# Altium footprint library VC_PCBLib.PcbLib: 63 footprints (part 2 of 4)
Each footprint in its own frame and in the unit in brackets; x right, y up, seen from the top. Pads: shape width x height; smd on the part's side, far side on the other; paste and mask are expansions set on the pad; w line width, h text height; cw(c..) or ccw(c..) is an arc to the next point about the centre after c.
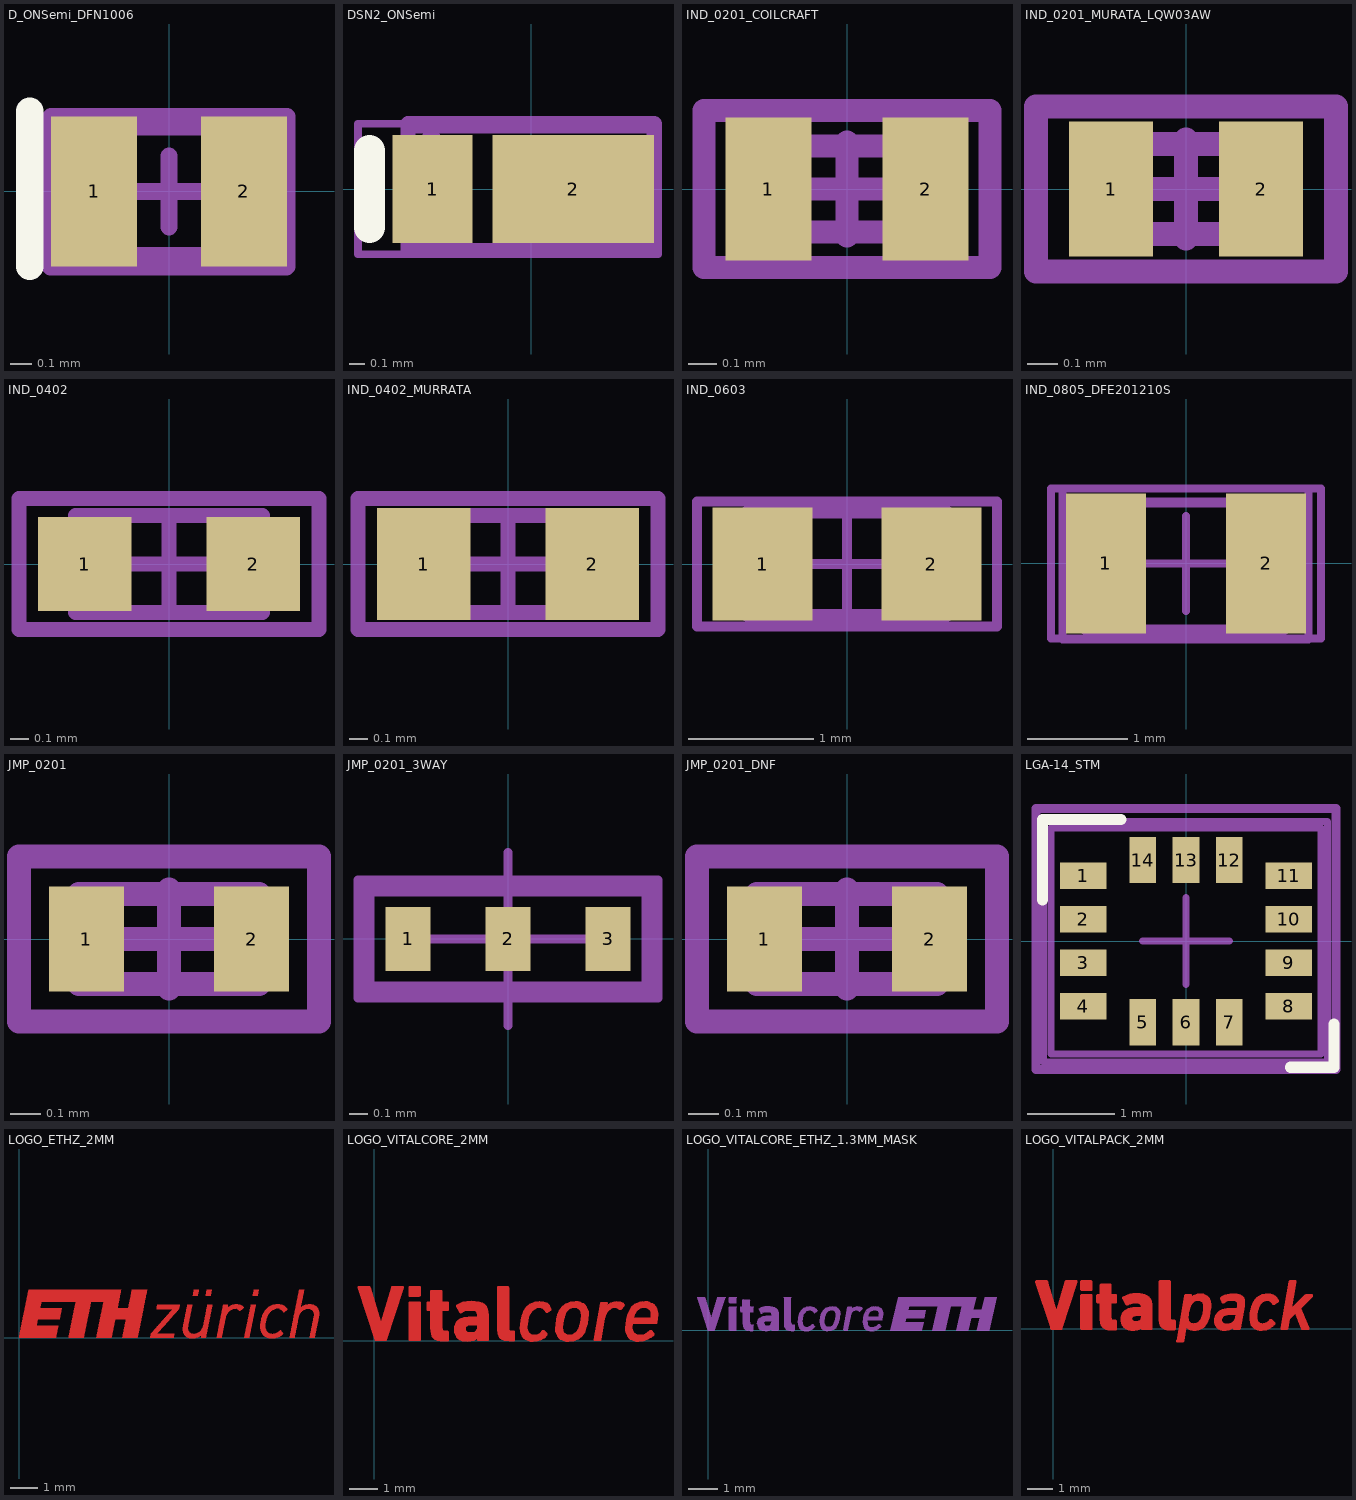
[diagram p1: the footprints below, top view; thin cyan lines are the x and y axes]

## D_ONSemi_DFN1006 [mm]
pads (2):
  rect 0.4x0.7 smd: 1(-0.35,0) 2(0.35,0)
Top Overlay:
  lines w0.127: -0.65,-0.35 -0.65,0.375
Top Assembly:
  circle w0.127: c-0.425,0.225 r0.025
  lines w0.08: -0.552,-0.352 -0.552,0.348 0.548,0.348 0.548,-0.352 -0.552,-0.352
Top Component Outline:
  lines w0.08: -0.5,-0.3 -0.5,0.3 0.5,0.3 0.5,-0.3 -0.5,-0.3
Top Courtyard:
  lines w0.08: -0.55,-0.35 -0.55,0.35 0.55,0.35 0.55,-0.35 -0.55,-0.35
Top Component Center:
  lines w0.08: -0.165,0 0.165,0 ; -0.05,0 0.05,0 ; 0,-0.165 0,0.165 ; 0,-0.05 0,0.05
3D body "DFN1006H4-2.stp": height 0.4, standoff 0, extent -0.5,-0.3 0.5,0.3

## DSN2_ONSemi [mm]
pads (2):
  rect 0.52x0.7 smd paste+0 mask+0: 1(-0.64,0)
  rect 1.05x0.7 smd paste+0 mask+0: 2(0.275,0)
Top Overlay:
  lines w0.2: -1.05,-0.25 -1.05,0.25
Top Assembly:
  lines w0.1: -0.8,-0.4 -0.8,0.425 0.8,0.425 0.8,-0.4 -0.8,-0.4
  lines w0.127: -0.65,-0.325 -0.65,0.325
Top Component Outline:
  lines w0.08: -0.8,-0.4 -0.8,0.4 0.8,0.4 0.8,-0.4 -0.8,-0.4
Top Courtyard:
  lines w0.05: -1.125,-0.425 0.825,-0.425 0.825,0.425 -1.125,0.425 -1.125,-0.425
Top Component Center:
  lines w0.08: -0.165,0 0.165,0 ; -0.05,0 0.05,0 ; 0,-0.165 0,0.165 ; 0,-0.05 0,0.05
  lines w0.1: -0.152,0 0.152,0 ; 0,-0.152 0,0.152
3D body "DSN2-152AB_ONS.step": height 0.31, standoff 0, extent -0.841,-0.406 0.741,0.406

## IND_0201_COILCRAFT [mm] "0201 Inductor"
height 0.52
pads (2):
  rect 0.3x0.5 smd: 1(-0.275,0) 2(0.275,0)
Top Assembly:
  lines w0.08: -0.5,-0.275 -0.5,0.275 0.5,0.275 0.5,-0.275 -0.5,-0.275
Top Component Outline:
  lines w0.08: -0.3,-0.15 -0.3,0.15 0.3,0.15 0.3,-0.15 -0.3,-0.15
Top Courtyard:
  lines w0.08: -0.5,-0.275 0.5,-0.275 0.5,0.275 -0.5,0.275 -0.5,-0.275
Top Component Center:
  lines w0.08: -0.165,0 0.165,0 ; -0.05,0 0.05,0 ; 0,-0.165 0,0.165 ; 0,-0.05 0,0.05
3D body "Coilcraft-0201DS.STEP": height 0.46, standoff 0, extent -0.293,-0.231 0.293,0.231

## IND_0201_MURATA_LQW03AW [mm] "0201 Inductor"
height 0.52
pads (2):
  rect 0.28x0.45 smd: 1(-0.25,0) 2(0.25,0)
Top Assembly:
  lines w0.08: -0.5,-0.275 -0.5,0.275 0.5,0.275 0.5,-0.275 -0.5,-0.275
Top Component Outline:
  lines w0.08: -0.3,-0.15 -0.3,0.15 0.3,0.15 0.3,-0.15 -0.3,-0.15
Top Courtyard:
  lines w0.08: -0.5,-0.275 0.5,-0.275 0.5,0.275 -0.5,0.275 -0.5,-0.275
Top Component Center:
  lines w0.08: -0.165,0 0.165,0 ; -0.05,0 0.05,0 ; 0,-0.165 0,0.165 ; 0,-0.05 0,0.05
3D body "LQW03AW5N6J00D.STEP": height 0.45, standoff 0, extent -0.265,-0.2 0.265,0.2

## IND_0402 [mm] "0402 Inductor"
height 0.52
pads (2):
  rect 0.5x0.5 smd: 1(-0.45,0) 2(0.45,0)
Top Assembly:
  lines w0.08: -0.8,-0.35 -0.8,0.35 0.8,0.35 0.8,-0.35 -0.8,-0.35
Top Component Outline:
  lines w0.08: -0.5,-0.26 0.5,-0.26 0.5,0.26 -0.5,0.26 -0.5,-0.26
Top Courtyard:
  lines w0.08: -0.8,-0.35 0.8,-0.35 0.8,0.35 -0.8,0.35 -0.8,-0.35
Top Component Center:
  lines w0.08: -0.26,0 0.26,0 ; 0,-0.26 0,0.26
3D body "FER 0402.STEP": height 0.56, standoff 0.04, extent -0.5,-0.262 0.5,0.262

## IND_0402_MURRATA [mm] "0402 Inductor"
height 0.52
pads (2):
  rect 0.5x0.6 smd: 1(-0.45,0) 2(0.45,0)
Top Assembly:
  lines w0.08: -0.8,-0.35 0.8,-0.35 0.8,0.35 -0.8,0.35 -0.8,-0.35
Top Component Outline:
  lines w0.08: -0.5,-0.26 -0.5,0.26 0.5,0.26 0.5,-0.26 -0.5,-0.26
Top Courtyard:
  lines w0.08: -0.8,-0.35 -0.8,0.35 0.8,0.35 0.8,-0.35 -0.8,-0.35
Top Component Center:
  lines w0.08: -0.26,0 0.26,0 ; 0,-0.26 0,0.26
3D body "LQW15AN5N7G80B.STEP": height 0.6, standoff 0, extent -0.5,-0.3 0.5,0.3

## IND_0603 [mm] "0603 Inductor"
height 0.89
pads (2):
  rect 0.8x0.9 smd: 1(-0.675,0) 2(0.675,0)
Top Assembly:
  lines w0.08: -1.2,-0.5 -1.2,0.5 1.2,0.5 1.2,-0.5 -1.2,-0.5
Top Component Outline:
  lines w0.1: -0.8,-0.41 -0.8,0.415 0.8,0.415 0.8,-0.41 -0.8,-0.41
Top Component Center:
  lines w0.08: -0.475,0 0.475,0 ; 0,-0.475 0,0.475
3D body "FER 0603.STEP": height 0.82, standoff 0, extent -0.8,-0.412 0.8,0.412

## IND_0805_DFE201210S [mm] "0805 Inductor"
height 0.89
pads (2):
  rect 0.8x1.4 smd: 1(-0.8,0) 2(0.8,0)
Top Assembly:
  lines w0.08: -1.35,-0.75 1.35,-0.75 1.35,0.75 -1.35,0.75 -1.35,-0.75
Top Component Outline:
  lines w0.1: -1.016,-0.66 0.991,-0.66 0.991,0.61 -1.016,0.61 -1.016,-0.66
Top Courtyard:
  lines w0.08: -1.237,-0.763 1.226,-0.763 1.226,0.75 -1.237,0.75 -1.237,-0.763
Top Component Center:
  lines w0.08: -0.475,0 0.475,0 ; 0,-0.475 0,0.475
3D body "FER 0805.STEP": height 1.02, standoff -0.26, extent -1,-0.639 1,0.635

## JMP_0201 [mm] "0201 Jumper"
height 0.26
pads (2):
  rect 0.25x0.35 smd: 1(-0.275,0) 2(0.275,0)
Top Assembly:
  lines w0.08: -0.5,-0.275 -0.5,0.275 0.5,0.275 0.5,-0.275 -0.5,-0.275
Top Component Outline:
  lines w0.08: -0.3,-0.15 -0.3,0.15 0.3,0.15 0.3,-0.15 -0.3,-0.15
Top Courtyard:
  lines w0.08: -0.5,-0.275 0.5,-0.275 0.5,0.275 -0.5,0.275 -0.5,-0.275
Top Component Center:
  lines w0.08: -0.165,0 0.165,0 ; -0.05,0 0.05,0 ; 0,-0.165 0,0.165 ; 0,-0.05 0,0.05
3D body "R_0201_0603Metric.step": height 0.22, standoff -0.01, extent -0.3,-0.15 0.3,0.15

## JMP_0201_3WAY [mm] "Jumper 3 pins 0201x2"
height 0.6
pads (3):
  rect 0.25x0.35 smd: 1(-0.55,0) 2(0,0) 3(0.55,0)
Top Assembly:
  lines w0.08: -0.225,-0.275 0.775,-0.275 0.775,0.275 -0.225,0.275 ; 0.225,-0.275 -0.775,-0.275 -0.775,0.275 0.225,0.275
Top Component Outline:
  lines w0.05: -0.775,-0.275 0.775,-0.275 0.775,0.275 -0.775,0.275 -0.775,-0.275
Top Courtyard:
  lines w0.05: -0.825,-0.325 0.825,-0.325 0.825,0.325 -0.825,0.325 -0.825,-0.325
Top Component Center:
  lines w0.05: -0.475,0 0.475,0 ; 0,-0.475 0,0.475
3D body "R_0201_0603Metric.step": height 0.22, standoff -0.01, extent -0.575,-0.15 0.025,0.15
3D body "R_0201_0603Metric.step": height 0.22, standoff -0.01, extent -0.025,-0.15 0.575,0.15

## JMP_0201_DNF [mm] "0201 Jumper, Not populated."
height 0.26
pads (2):
  rect 0.25x0.35 smd: 1(-0.275,0) 2(0.275,0)
Top Assembly:
  lines w0.08: -0.5,-0.275 0.5,-0.275 0.5,0.275 -0.5,0.275 -0.5,-0.275
Top Component Outline:
  lines w0.08: -0.3,-0.15 0.3,-0.15 0.3,0.15 -0.3,0.15 -0.3,-0.15
Top Courtyard:
  lines w0.08: -0.5,-0.275 -0.5,0.275 0.5,0.275 0.5,-0.275 -0.5,-0.275
Top Component Center:
  lines w0.08: -0.165,0 0.165,0 ; -0.05,0 0.05,0 ; 0,-0.165 0,0.165 ; 0,-0.05 0,0.05
3D body "R_0201_0603Metric.step": height 0.22, standoff -0.01, extent -0.3,-0.15 0.3,0.15

## LGA-14_STM [mil] "LG1-14 package of STM comatible with various components"
pads (14):
  rect 21x12 smd: 1(-46.5,29.54) 2(-46.5,9.85) 3(-46.5,-9.85) 4(-46.5,-29.54) 8(46.5,-29.54) 9(46.5,-9.85) 10(46.5,9.85) 11(46.5,29.54)
  rect 12x21 smd: 5(-19.69,-36.74) 6(0,-36.74) 7(19.69,-36.74) 12(19.69,36.74) 13(0,36.74) 14(-19.69,36.74)
Top Overlay:
  lines w5: -64.96,18.7 -64.96,55.12 -29.53,55.12 ; 47.24,-57.09 66.93,-57.09 66.93,-37.4
Top Assembly:
  lines w3.94: -67.91,-58.07 67.91,-58.07 67.91,60.04 -67.91,60.04 -67.91,-58.07
Top Component Outline:
  lines w3.15: -61.02,-51.18 -61.02,51.18 61.02,51.18 61.02,-51.18 -61.02,-51.18
Top Courtyard:
  lines w3.15: -64.48,-54.64 -64.48,54.14 63.98,54.14 63.98,-54.64 -64.48,-54.64
Top Component Center:
  lines w3.15: -19.68,0 19.69,0 ; 0,-19.69 0,19.68
3D body "QFN_DHCXTR_STM.step": height 55.12, standoff 0, extent -60.98,-50.98 60.99,50.99

## LOGO_ETHZ_2MM [mm] "Logo ETH Zurich"
Top Layer:
  drawing of 11 lines, arcs and shapes, not listed
Top Solder:
  drawing of 10 lines, arcs and shapes, not listed

## LOGO_VITALCORE_2MM [mm]
Top Layer:
  region: 9.675,0.35 9.5,0.225 9.3,0.175 9.125,0.2 9.025,0.35 9,0.525 9.025,0.6 9.05,0.6 9.05,0.775 9.125,1 9.25,1.125 9.425,1.175 9.6,1.125 9.675,1 9.7,0.875 9.7,0.775 9.05,0.775 9.05,0.6 9.85,0.6 9.9,0.725 9.925,0.95 9.875,1.15 9.625,1.35 9.4,1.375 9.075,1.225 8.85,0.9 8.8,0.45 8.85,0.15 8.975,0.025 9.15,-0.025 9.35,0 9.5,0.025 9.775,0.175 9.775,0.25
  region: 8.146,1.327 7.934,1.327 7.703,0.024 7.906,-0.001 8.102,0.934 8.227,1.115 8.352,1.165 8.489,1.149 8.598,1.081 8.745,1.252 8.617,1.336 8.436,1.365 8.315,1.308 8.152,1.218 8.131,1.174 8.15,1.325
  region: 6.95,1.35 6.675,1.275 6.45,1 6.35,0.575 6.375,0.25 6.475,0.075 6.65,0 6.825,-0.025 7.025,0 7.3,0.2 7.475,0.65 7.475,1.025 7.4,1.225 7.2,1.35 6.95,1.35 6.95,1.15 7.025,1.15 7.15,1.125 7.25,0.975 7.225,0.625 7.1,0.3 6.95,0.2 6.75,0.2 6.625,0.25 6.575,0.5 6.6,0.75 6.725,1.025 6.875,1.125 6.95,1.15
  region: 6.018,0.989 6.186,1.111 6.024,1.308 5.765,1.378 5.56,1.33 5.366,1.21 5.19,0.906 5.107,0.57 5.131,0.259 5.248,0.069 5.36,-0.008 5.614,-0.024 5.843,0.035 6.01,0.187 6.048,0.243 5.925,0.352 5.789,0.253 5.611,0.173 5.427,0.216 5.344,0.349 5.352,0.688 5.416,0.946 5.603,1.14 5.779,1.154 5.899,1.148 5.978,1.063 6.025,1
  region: 4.698,0.394 4.698,1.868 4.325,1.868 4.325,0.275 4.375,0.15 4.475,0.05 4.6,0 4.9,0 4.9,0.3 4.756,0.336
  region: 3.625,0.825 3.275,0.825 3.05,0.775 2.875,0.65 2.8,0.425 2.825,0.225 2.95,0.05 3.225,-0.025 3.45,0 3.625,0.125 3.625,0.4 3.55,0.325 3.45,0.275 3.275,0.275 3.175,0.35 3.175,0.45 3.225,0.525 3.35,0.55 3.625,0.55
  region: 2.875,1.225 3.027,0.959 3.142,1.046 3.38,1.048 3.551,1.033 3.597,0.968 3.619,0.832 3.625,0.825 3.625,0.025 3.975,0.025 3.975,0.925 3.95,1.125 3.825,1.275 3.625,1.35 3.45,1.375 3.225,1.375 3.025,1.325
  region: 2,1.725 2.35,1.725 2.375,1.35 2.575,1.35 2.575,1.05 2.375,1.05 2.35,0.575 2.375,0.4 2.4,0.325 2.55,0.325 2.575,0.3 2.575,0 2.5,-0.025 2.35,0 2.125,0.05 2,0.2 1.975,0.425 1.975,0.675 1.967,1.062 1.85,1.05 1.85,1.325 2,1.35 1.975,1.725 2.025,1.75
  region: 1.225,1.35 1.218,0.022 1.602,0.014 1.602,1.339
  region: 1.225,1.875 1.225,1.575 1.6,1.575 1.6,1.875
  region: 0.031,0.009 -0.575,1.875 -0.153,1.877 0.232,0.627 0.613,1.881 1.019,1.875 0.405,0.009 0.037,0.014
  lines w0.05: 3.364,0.266 3.473,0.277 3.55,0.312 3.597,0.369 3.613,0.451 3.613,0.542 3.596,0.558 3.408,0.558 3.302,0.549 3.229,0.522 3.185,0.474 3.171,0.406 3.183,0.345 3.22,0.301 3.28,0.274 3.364,0.266 ; 3.364,0.266 3.364,0.266 ; 5.553,-0.024 5.695,-0.009 5.824,0.035 5.936,0.105 6.031,0.199 6.039,0.22 6.031,0.238 5.931,0.34 5.913,0.347 5.895,0.335 5.821,0.263 5.745,0.215 5.667,0.186 5.586,0.177 5.472,0.197 5.393,0.253 5.347,0.345 5.332,0.47 5.359,0.691 5.392,0.823 5.437,0.942 5.5,1.035 5.577,1.104 5.666,1.146 5.763,1.16 5.845,1.151 5.91,1.122 5.964,1.074 6.008,1.005 6.026,0.993 6.047,0.997 6.166,1.083 6.179,1.1 6.177,1.121 6.115,1.223 6.028,1.297 5.918,1.343 5.785,1.359 5.608,1.337 5.455,1.271 5.329,1.164 5.233,1.016 5.177,0.871 5.139,0.714 5.109,0.431 5.116,0.33 5.138,0.24 5.175,0.162 5.225,0.097 5.289,0.045 5.365,0.007 5.453,-0.016 5.553,-0.024 ; 5.553,-0.024 5.553,-0.024 ; 9.253,-0.024 9.407,-0.007 9.547,0.04 9.669,0.111 9.772,0.199 9.783,0.221 9.775,0.241 9.689,0.337 9.671,0.344 9.648,0.335 9.575,0.273 9.489,0.223 9.393,0.189 9.289,0.177 9.166,0.195 9.078,0.249 9.025,0.342 9.007,0.473 9.016,0.586 9.035,0.602 9.844,0.602 9.866,0.61 9.877,0.63 9.91,0.909 9.901,1.013 9.877,1.104 9.837,1.181 9.784,1.245 9.72,1.294 9.645,1.33 9.56,1.352 9.468,1.359 9.283,1.335 9.128,1.268 9.004,1.158 8.911,1.011 8.86,0.879 8.824,0.73 8.795,0.44 8.802,0.336 8.824,0.244 8.86,0.164 8.911,0.098 8.976,0.045 9.055,0.007 9.147,-0.016 9.253,-0.024 ; 9.253,-0.024 9.253,-0.024 ; -0.568,1.853 -0.565,1.875 -0.543,1.883 -0.184,1.883 -0.161,1.877 -0.148,1.856 0.227,0.624 0.235,0.624 0.6,1.856 0.613,1.877 0.636,1.883 0.992,1.883 1.011,1.875 1.014,1.853 0.418,0.034 0.405,0.014 0.385,0.006 0.064,0.006 0.041,0.014 0.028,0.034 -0.568,1.853 ; 1.217,0.034 1.224,0.014 1.244,0.006 1.576,0.006 1.596,0.014 1.603,0.034 1.603,1.315 1.596,1.335 1.576,1.342 1.244,1.342 1.224,1.335 1.217,1.315 1.217,0.034 ; 1.217,1.582 1.224,1.562 1.244,1.555 1.576,1.555 1.596,1.562 1.603,1.582 1.603,1.856 1.596,1.876 1.576,1.883 1.244,1.883 1.224,1.876 1.217,1.856 1.217,1.582 ; 1.85,1.085 1.858,1.065 1.878,1.058 1.961,1.058 1.977,1.041 1.977,0.434 2,0.235 2.03,0.159 2.074,0.097 2.132,0.049 2.205,0.016 2.295,-0.004 2.402,-0.01 2.548,-0.01 2.569,-0.003 2.576,0.017 2.576,0.29 2.569,0.31 2.548,0.318 2.482,0.318 2.426,0.325 2.388,0.347 2.367,0.388 2.361,0.451 2.361,1.041 2.377,1.058 2.548,1.058 2.569,1.065 2.576,1.085 2.576,1.315 2.569,1.335 2.548,1.342 2.377,1.342 2.361,1.359 2.361,1.718 2.353,1.738 2.333,1.745 2.005,1.745 1.985,1.738 1.977,1.718 1.977,1.359 1.961,1.342 1.878,1.342 1.858,1.335 1.85,1.315 1.85,1.085 ; 2.804,0.384 2.814,0.488 2.844,0.576 2.892,0.65 2.957,0.71 3.037,0.757 3.132,0.789 3.359,0.815 3.596,0.815 3.613,0.832 3.613,0.881 3.6,0.962 3.556,1.019 3.472,1.052 3.339,1.063 3.163,1.038 3.041,0.978 3.021,0.971 3.005,0.983 2.881,1.201 2.877,1.224 2.889,1.24 2.984,1.295 3.097,1.336 3.231,1.363 3.386,1.373 3.537,1.366 3.663,1.344 3.766,1.308 3.846,1.256 3.907,1.189 3.948,1.106 3.972,1.006 3.98,0.889 3.98,0.034 3.972,0.014 3.952,0.006 3.646,0.006 3.626,0.014 3.618,0.034 3.618,0.122 3.615,0.122 3.554,0.062 3.474,0.016 3.373,-0.014 3.248,-0.024 3.079,0 3.003,0.03 2.937,0.073 2.882,0.13 2.84,0.201 2.813,0.285 2.804,0.384 ; 4.312,0.415 4.312,1.856 4.32,1.876 4.34,1.883 4.671,1.883 4.691,1.876 4.699,1.856 4.699,0.445 4.706,0.387 4.727,0.347 4.763,0.325 4.815,0.318 4.873,0.318 4.893,0.31 4.9,0.29 4.9,0.017 4.893,-0.003 4.873,-0.01 4.726,-0.01 4.537,0.014 4.465,0.046 4.409,0.091 4.365,0.15 4.335,0.224 4.312,0.415 ; 6.346,0.431 6.357,0.579 6.384,0.741 6.425,0.896 6.473,1.022 6.574,1.174 6.702,1.278 6.855,1.339 7.034,1.359 7.135,1.351 7.224,1.328 7.301,1.29 7.365,1.238 7.416,1.173 7.453,1.096 7.476,1.006 7.484,0.906 7.473,0.757 7.445,0.595 7.403,0.439 7.354,0.313 7.254,0.161 7.127,0.056 6.974,-0.005 6.796,-0.024 6.695,-0.016 6.605,0.007 6.528,0.045 6.464,0.097 6.413,0.162 6.376,0.24 6.354,0.33 6.346,0.431 ; 6.57,0.467 6.603,0.713 6.675,0.942 6.736,1.037 6.81,1.105 6.898,1.146 7.001,1.16 7.119,1.14 7.198,1.083 7.243,0.992 7.257,0.87 7.225,0.623 7.155,0.393 7.094,0.3 7.019,0.232 6.93,0.191 6.827,0.177 6.71,0.197 6.63,0.253 6.585,0.344 6.57,0.467 ; 7.7,0.034 7.924,1.301 7.934,1.321 7.954,1.328 8.123,1.328 8.141,1.321 8.145,1.301 8.117,1.16 8.12,1.16 8.186,1.241 8.27,1.304 8.37,1.344 8.484,1.359 8.627,1.332 8.684,1.301 8.73,1.259 8.737,1.241 8.73,1.221 8.617,1.099 8.599,1.088 8.578,1.094 8.496,1.141 8.393,1.16 8.325,1.152 8.264,1.13 8.164,1.046 8.092,0.919 8.048,0.76 7.918,0.034 7.91,0.014 7.891,0.006 7.725,0.006 7.706,0.014 7.7,0.034 ; 9.057,0.793 9.109,0.956 9.169,1.047 9.246,1.112 9.338,1.152 9.441,1.166 9.551,1.149 9.631,1.101 9.681,1.019 9.697,0.903 9.686,0.793 9.664,0.776 9.068,0.776 9.057,0.793

## LOGO_VITALCORE_ETHZ_1.3MM_MASK [mm]
Top Solder:
  drawing of 390 lines, arcs and shapes, not listed

## LOGO_VITALPACK_2MM [mm]
Top Layer:
  region: 9.4,1.875 9.05,0.025 9.275,0 9.35,0.375 9.625,0.65 9.675,0.6 9.9,0 9.875,-0.025 10.15,0 9.775,0.825 10.25,1.325 10.025,1.3 9.425,0.7 9.6,1.875
  region: 8.9,1.1 8.775,1.275 8.425,1.375 8.175,1.25 7.9,0.95 7.8,0.475 7.85,0.15 8.075,-0.025 8.425,-0.025 8.675,0.1 8.775,0.225 8.625,0.375 8.45,0.2 8.2,0.175 8.075,0.325 8.075,0.775 8.2,1.025 8.4,1.125 8.55,1.15 8.725,0.975 8.9,1.075
  region: 6.675,1.2 6.75,1.05 6.925,1.175 7.2,1.125 7.3,1.125 7.375,0.95 7.325,0.8 7.3,0.75 6.95,0.75 6.65,0.7 6.5,0.55 6.45,0.4 6.45,0.2 6.525,0.05 6.775,-0.05 7,-0.025 7.2,0.1 7.225,0.125 7.2,-0.025 7.4,0 7.5,0.6 7.275,0.6 7.175,0.275 6.95,0.175 6.75,0.175 6.65,0.35 6.75,0.55 7.025,0.6 7.5,0.6 7.575,0.95 7.525,1.225 7.325,1.375 6.95,1.35 6.675,1.25 6.65,1.225
  region: 5.225,1.3 4.925,-0.475 5.125,-0.5 5.225,0.175 5.4,0 5.65,-0.025 5.925,0.05 6.15,0.4 6.2,0.95 6.125,1.25 5.975,1.35 5.625,1.325 5.475,1.25 5.45,1.275 5.375,0.925 5.55,1.1 5.9,1.125 6,0.975 5.95,0.5 5.75,0.2 5.475,0.175 5.325,0.325 5.325,0.675 5.375,0.925 5.45,1.275 5.25,1.3
  region: 4.225,1.825 4.225,0.3 4.3,0.1 4.5,-0.025 4.8,-0.025 4.8,0.35 4.65,0.325 4.6,0.425 4.6,1.85 4.25,1.875
  region: 2.775,1.225 2.95,0.95 3.2,1.05 3.425,1.05 3.525,0.95 3.55,0.825 3.4,0.8 2.95,0.8 2.825,0.65 2.7,0.4 2.8,0.125 2.95,0.025 3.25,-0.025 3.5,0.075 3.525,0.075 3.525,-0.025 3.9,-0.025 3.9,0.55 3.525,0.55 3.55,0.4 3.425,0.3 3.275,0.275 3.125,0.275 3.075,0.4 3.15,0.525 3.425,0.55 3.9,0.55 3.875,1 3.8,1.225 3.45,1.4 3.125,1.375
  region: 1.9,1.75 1.9,1.35 1.75,1.325 1.775,1.075 1.9,1.025 1.9,0.25 2,0.025 2.3,-0.025 2.475,0 2.475,0.325 2.3,0.325 2.3,0.85 2.275,1.025 2.475,1.05 2.475,1.35 2.25,1.325 2.275,1.725
  region: 1.125,1.325 1.1,0 1.5,0 1.5,1.325 1.15,1.325
  region: 1.125,1.575 1.525,1.55 1.475,1.875 1.125,1.875
  region: -0.66,1.857 -0.075,0.075 0,-0.025 0.3,-0.025 0.925,1.875 0.525,1.9 0.15,0.625 -0.25,1.875 -0.675,1.875
  lines w0.1: 0.531,1.876 ccw(c0.538,1.841) 0.526,1.875 ccw(c0.536,1.847) 0.522,1.873 ccw(c0.535,1.848) 0.512,1.864 ccw(c0.543,1.843) 0.509,1.86 ccw(c0.552,1.838) 0.507,1.855 ccw(c0.566,1.833) 0.505,1.85 0.14,0.616 0.132,0.616 -0.244,1.85 ccw(c-0.297,1.835) -0.248,1.86 ccw(c-0.282,1.843) -0.251,1.864 ccw(c-0.277,1.846) -0.254,1.868 ccw(c-0.274,1.848) -0.265,1.875 ccw(c-0.277,1.841) -0.27,1.876 ccw(c-0.279,1.832) -0.275,1.877 ccw(c-0.28,1.819) -0.28,1.877 -0.64,1.877 ccw(c-0.641,1.837) -0.651,1.876 ccw(c-0.643,1.849) -0.655,1.875 ccw(c-0.646,1.854) -0.659,1.872 ccw(c-0.648,1.857) -0.662,1.869 ccw(c-0.648,1.858) -0.666,1.862 ccw(c-0.644,1.857) -0.666,1.858 ccw(c-0.638,1.856) -0.666,1.853 ccw(c-0.628,1.858) -0.665,1.847 -0.067,0.024 ccw(c-0.015,0.041) -0.063,0.015 ccw(c-0.026,0.035) -0.061,0.011 ccw(c-0.031,0.032) -0.058,0.007 ccw(c-0.034,0.029) -0.051,0.001 ccw(c-0.034,0.029) -0.042,-0.002 ccw(c-0.032,0.035) -0.037,-0.003 ccw(c-0.032,0.042) -0.031,-0.004 0.289,-0.004 ccw(c0.29,0.028) 0.303,-0.001 ccw(c0.289,0.028) 0.313,0.007 ccw(c0.284,0.033) 0.316,0.011 ccw(c0.279,0.036) 0.319,0.015 ccw(c0.273,0.04) 0.321,0.019 ccw(c0.265,0.043) 0.323,0.024 0.92,1.847 ccw(c0.888,1.857) 0.922,1.858 ccw(c0.898,1.857) 0.921,1.862 ccw(c0.902,1.858) 0.92,1.866 ccw(c0.903,1.858) 0.911,1.875 ccw(c0.9,1.853) 0.907,1.876 ccw(c0.899,1.849) 0.903,1.877 ccw(c0.898,1.843) 0.898,1.877 0.541,1.877 ccw(c0.541,1.826) 0.531,1.876 ; 8.625,0.335 cw(c8.637,0.313) 8.629,0.337 cw(c8.636,0.319) 8.64,0.337 cw(c8.635,0.319) 8.644,0.336 cw(c8.633,0.314) 8.651,0.331 8.75,0.229 cw(c8.726,0.205) 8.753,0.225 cw(c8.731,0.208) 8.756,0.222 cw(c8.735,0.21) 8.758,0.214 cw(c8.735,0.21) 8.758,0.206 cw(c8.731,0.211) 8.757,0.202 cw(c8.726,0.212) 8.756,0.198 cw(c8.716,0.218) 8.75,0.19 cw(c8.29,0.555) 8.441,-0.012 cw(c8.274,0.62) 8.272,-0.034 cw(c8.27,0.591) 8.191,-0.029 cw(c8.256,0.477) 8.117,-0.014 cw(c8.212,0.348) 7.902,0.138 cw(c8.232,0.358) 7.869,0.198 cw(c8.288,0.383) 7.845,0.265 cw(c8.433,0.417) 7.826,0.422 cw(c8.891,0.421) 7.827,0.471 cw(c9.52,0.381) 7.87,0.768 cw(c9.369,0.418) 7.886,0.832 cw(c9.177,0.472) 7.905,0.893 cw(c8.86,0.58) 7.951,1.009 cw(c8.592,0.701) 7.986,1.073 cw(c8.472,0.783) 8.232,1.296 cw(c8.478,0.76) 8.36,1.338 cw(c8.501,0.642) 8.504,1.352 cw(c8.505,0.747) 8.56,1.349 cw(c8.513,0.833) 8.613,1.342 cw(c8.525,0.898) 8.662,1.329 cw(c8.554,0.976) 8.819,1.232 cw(c8.526,0.956) 8.897,1.114 cw(c8.837,1.094) 8.898,1.109 cw(c8.853,1.098) 8.899,1.105 cw(c8.864,1.099) 8.899,1.1 cw(c8.874,1.099) 8.897,1.089 cw(c8.872,1.1) 8.895,1.085 cw(c8.867,1.103) 8.893,1.082 cw(c8.855,1.114) 8.886,1.075 8.767,0.989 cw(c8.75,1.018) 8.758,0.986 cw(c8.751,1.011) 8.728,0.998 ccw(c8.302,0.774) 8.711,1.028 ccw(c8.398,0.834) 8.693,1.054 ccw(c8.459,0.879) 8.673,1.078 ccw(c8.504,0.922) 8.63,1.115 ccw(c8.512,0.932) 8.578,1.139 ccw(c8.5,0.897) 8.549,1.147 ccw(c8.485,0.806) 8.482,1.153 ccw(c8.482,0.818) 8.296,1.096 ccw(c8.505,0.782) 8.233,1.043 ccw(c8.559,0.731) 8.155,0.934 ccw(c8.735,0.652) 8.136,0.889 ccw(c8.958,0.563) 8.118,0.841 ccw(c9.197,0.483) 8.102,0.789 ccw(c9.601,0.375) 8.06,0.582 ccw(c9.378,0.404) 8.055,0.536 ccw(c8.839,0.453) 8.05,0.461 ccw(c8.641,0.46) 8.053,0.407 ccw(c8.49,0.446) 8.06,0.358 ccw(c8.382,0.424) 8.072,0.315 ccw(c8.266,0.376) 8.172,0.196 ccw(c8.274,0.397) 8.21,0.18 ccw(c8.3,0.498) 8.305,0.168 ccw(c8.306,0.521) 8.402,0.181 ccw(c8.305,0.522) 8.464,0.205 ccw(c8.286,0.559) 8.494,0.222 ccw(c8.261,0.6) 8.525,0.243 ccw(c8.221,0.654) 8.555,0.267 ccw(c8.127,0.761) 8.615,0.325 cw(c8.651,0.296) 8.618,0.329 cw(c8.645,0.303) 8.622,0.332 cw(c8.64,0.309) 8.625,0.335 ; 1.123,0.024 ccw(c1.156,0.024) 1.125,0.015 ccw(c1.151,0.022) 1.126,0.011 ccw(c1.149,0.022) 1.146,-0.003 ccw(c1.151,0.031) 1.151,-0.004 1.483,-0.004 ccw(c1.483,0.029) 1.492,-0.002 ccw(c1.485,0.024) 1.496,-0.001 ccw(c1.485,0.022) 1.51,0.019 ccw(c1.476,0.024) 1.511,0.024 1.511,1.308 ccw(c1.478,1.308) 1.509,1.317 ccw(c1.483,1.309) 1.508,1.321 ccw(c1.485,1.31) 1.488,1.335 ccw(c1.483,1.3) 1.483,1.335 1.151,1.335 ccw(c1.151,1.303) 1.142,1.334 ccw(c1.15,1.308) 1.138,1.332 ccw(c1.149,1.31) 1.124,1.312 ccw(c1.158,1.308) 1.123,1.308 1.123,0.024 ; 1.123,1.576 ccw(c1.156,1.576) 1.125,1.567 ccw(c1.151,1.574) 1.126,1.563 ccw(c1.149,1.574) 1.146,1.549 ccw(c1.151,1.583) 1.151,1.548 1.483,1.548 ccw(c1.483,1.581) 1.492,1.55 ccw(c1.485,1.576) 1.496,1.551 ccw(c1.485,1.574) 1.51,1.571 ccw(c1.476,1.576) 1.511,1.576 1.511,1.85 ccw(c1.478,1.85) 1.509,1.859 ccw(c1.483,1.851) 1.508,1.863 ccw(c1.485,1.852) 1.488,1.877 ccw(c1.483,1.843) 1.483,1.877 1.151,1.877 ccw(c1.151,1.845) 1.142,1.876 ccw(c1.15,1.85) 1.138,1.875 ccw(c1.149,1.852) 1.124,1.855 ccw(c1.158,1.85) 1.123,1.85 1.123,1.576 ; 1.758,1.078 ccw(c1.791,1.078) 1.76,1.069 ccw(c1.786,1.076) 1.761,1.065 ccw(c1.784,1.076) 1.781,1.051 ccw(c1.786,1.085) 1.786,1.05 1.869,1.05 cw(c1.869,1.026) 1.875,1.05 cw(c1.871,1.034) 1.877,1.049 cw(c1.872,1.036) 1.88,1.048 cw(c1.873,1.037) 1.884,1.042 cw(c1.869,1.036) 1.885,1.04 cw(c1.864,1.035) 1.885,1.037 cw(c1.857,1.034) 1.886,1.034 1.886,0.425 ccw(c2.705,0.415) 1.9,0.261 ccw(c2.36,0.354) 1.919,0.193 ccw(c2.244,0.312) 1.946,0.136 ccw(c2.192,0.281) 1.982,0.087 ccw(c2.194,0.286) 2.083,0.018 ccw(c2.242,0.395) 2.148,-0.004 ccw(c2.281,0.561) 2.224,-0.016 ccw(c2.309,0.834) 2.312,-0.02 2.458,-0.02 ccw(c2.458,0.012) 2.467,-0.019 ccw(c2.46,0.007) 2.472,-0.018 ccw(c2.46,0.005) 2.486,0.002 ccw(c2.451,0.007) 2.486,0.007 2.486,0.281 ccw(c2.453,0.281) 2.485,0.29 ccw(c2.459,0.283) 2.483,0.294 ccw(c2.46,0.283) 2.463,0.309 ccw(c2.458,0.274) 2.458,0.309 2.392,0.309 cw(c2.389,0.531) 2.345,0.313 cw(c2.369,0.428) 2.326,0.319 cw(c2.358,0.398) 2.311,0.327 cw(c2.352,0.389) 2.287,0.352 cw(c2.373,0.401) 2.28,0.369 cw(c2.416,0.416) 2.274,0.39 cw(c2.494,0.43) 2.271,0.414 cw(c2.625,0.441) 2.27,0.442 2.27,1.034 cw(c2.295,1.034) 2.271,1.04 cw(c2.287,1.036) 2.272,1.042 cw(c2.284,1.037) 2.273,1.044 cw(c2.283,1.038) 2.278,1.049 cw(c2.285,1.034) 2.281,1.05 cw(c2.286,1.029) 2.284,1.05 cw(c2.287,1.022) 2.287,1.05 2.458,1.05 ccw(c2.458,1.083) 2.467,1.052 ccw(c2.46,1.078) 2.472,1.053 ccw(c2.46,1.076) 2.486,1.073 ccw(c2.451,1.078) 2.486,1.078 2.486,1.308 ccw(c2.453,1.308) 2.485,1.317 ccw(c2.459,1.309) 2.483,1.321 ccw(c2.46,1.31) 2.463,1.335 ccw(c2.458,1.3) 2.458,1.335 2.287,1.335 cw(c2.286,1.36) 2.281,1.336 cw(c2.285,1.352) 2.278,1.337 cw(c2.283,1.349) 2.276,1.338 cw(c2.283,1.348) 2.272,1.343 cw(c2.287,1.35) 2.271,1.346 cw(c2.292,1.351) 2.27,1.349 cw(c2.299,1.352) 2.27,1.352 2.27,1.711 ccw(c2.238,1.712) 2.269,1.721 ccw(c2.243,1.713) 2.267,1.725 ccw(c2.245,1.714) 2.247,1.739 ccw(c2.242,1.704) 2.242,1.739 1.913,1.739 ccw(c1.913,1.707) 1.904,1.738 ccw(c1.912,1.712) 1.9,1.736 ccw(c1.911,1.714) 1.886,1.716 ccw(c1.92,1.712) 1.886,1.711 1.886,1.352 cw(c1.861,1.352) 1.885,1.346 cw(c1.869,1.35) 1.884,1.343 cw(c1.872,1.349) 1.883,1.341 cw(c1.873,1.348) 1.877,1.337 cw(c1.871,1.352) 1.875,1.336 cw(c1.87,1.357) 1.872,1.335 cw(c1.869,1.364) 1.869,1.335 1.786,1.335 ccw(c1.786,1.303) 1.777,1.334 ccw(c1.784,1.308) 1.773,1.332 ccw(c1.784,1.31) 1.759,1.312 ccw(c1.793,1.308) 1.758,1.308 1.758,1.078 ; 2.714,0.375 ccw(c3.182,0.37) 2.738,0.223 ccw(c3.085,0.341) 2.765,0.161 ccw(c3.071,0.335) 2.9,0.028 ccw(c3.11,0.398) 2.958,0 ccw(c3.133,0.459) 3.022,-0.019 ccw(c3.15,0.533) 3.089,-0.03 ccw(c3.159,0.61) 3.159,-0.034 ccw(c3.162,0.694) 3.261,-0.027 ccw(c3.182,0.54) 3.306,-0.019 ccw(c3.198,0.465) 3.348,-0.008 ccw(c3.216,0.408) 3.386,0.006 ccw(c3.241,0.352) 3.452,0.042 ccw(c3.263,0.319) 3.527,0.112 3.53,0.112 3.53,0.024 ccw(c3.563,0.024) 3.531,0.015 ccw(c3.558,0.022) 3.533,0.011 ccw(c3.556,0.022) 3.553,-0.003 ccw(c3.558,0.031) 3.558,-0.004 3.865,-0.004 ccw(c3.865,0.029) 3.874,-0.002 ccw(c3.866,0.024) 3.878,-0.001 ccw(c3.867,0.022) 3.892,0.019 ccw(c3.858,0.024) 3.893,0.024 3.893,0.882 ccw(c3.177,0.893) 3.873,1.06 ccw(c3.458,0.955) 3.847,1.134 ccw(c3.534,0.989) 3.809,1.197 ccw(c3.537,0.988) 3.696,1.292 ccw(c3.469,0.865) 3.619,1.324 ccw(c3.404,0.666) 3.527,1.347 ccw(c3.343,0.329) 3.421,1.361 ccw(c3.302,-0.197) 3.298,1.366 ccw(c3.296,0.112) 3.172,1.36 ccw(c3.279,0.297) 3.114,1.352 ccw(c3.262,0.401) 3.06,1.342 ccw(c3.243,0.49) 3.008,1.329 ccw(c3.212,0.598) 2.916,1.297 ccw(c3.167,0.704) 2.835,1.256 ccw(c3.135,0.758) 2.8,1.233 ccw(c2.815,1.207) 2.793,1.227 ccw(c2.811,1.211) 2.79,1.224 ccw(c2.81,1.212) 2.787,1.213 ccw(c2.815,1.211) 2.787,1.208 ccw(c2.821,1.212) 2.788,1.204 ccw(c2.829,1.214) 2.789,1.199 ccw(c2.839,1.218) 2.791,1.194 2.916,0.976 ccw(c2.942,0.991) 2.922,0.969 ccw(c2.937,0.986) 2.925,0.966 ccw(c2.935,0.983) 2.928,0.964 ccw(c2.935,0.983) 2.94,0.964 ccw(c2.934,0.988) 2.944,0.965 ccw(c2.932,0.993) 2.948,0.967 ccw(c2.928,1) 2.952,0.97 cw(c3.177,0.662) 3.019,1.009 cw(c3.211,0.592) 3.074,1.031 cw(c3.231,0.526) 3.138,1.046 cw(c3.246,0.446) 3.211,1.055 cw(c3.25,0.372) 3.251,1.056 cw(c3.259,0.31) 3.361,1.049 cw(c3.307,0.679) 3.404,1.04 cw(c3.342,0.808) 3.439,1.027 cw(c3.373,0.878) 3.468,1.011 cw(c3.393,0.907) 3.49,0.991 cw(c3.39,0.906) 3.517,0.94 cw(c3.324,0.886) 3.523,0.909 cw(c3.221,0.874) 3.525,0.873 3.525,0.823 cw(c3.5,0.823) 3.524,0.817 cw(c3.508,0.821) 3.523,0.815 cw(c3.511,0.82) 3.522,0.813 cw(c3.512,0.82) 3.516,0.808 cw(c3.51,0.823) 3.514,0.807 cw(c3.509,0.828) 3.511,0.807 cw(c3.508,0.835) 3.508,0.807 3.27,0.807 ccw(c3.263,-0.168) 3.085,0.79 ccw(c3.214,0.119) 3.004,0.77 ccw(c3.17,0.255) 2.931,0.74 ccw(c3.124,0.347) 2.868,0.702 ccw(c3.087,0.398) 2.814,0.655 ccw(c3.084,0.406) 2.721,0.459 ccw(c3.229,0.377) 2.714,0.375 ; 3.082,0.397 cw(c3.243,0.4) 3.091,0.454 cw(c3.201,0.413) 3.103,0.477 cw(c3.203,0.41) 3.14,0.513 cw(c3.23,0.37) 3.166,0.526 cw(c3.256,0.308) 3.197,0.537 cw(c3.282,0.206) 3.232,0.544 cw(c3.305,0.054) 3.274,0.548 cw(c3.319,-0.162) 3.32,0.55 3.508,0.55 cw(c3.508,0.525) 3.514,0.549 cw(c3.51,0.533) 3.516,0.548 cw(c3.511,0.536) 3.519,0.547 cw(c3.512,0.537) 3.523,0.541 cw(c3.508,0.535) 3.524,0.539 cw(c3.503,0.534) 3.524,0.536 cw(c3.496,0.533) 3.525,0.533 3.525,0.442 cw(c3.314,0.439) 3.515,0.375 cw(c3.369,0.423) 3.502,0.347 cw(c3.377,0.419) 3.462,0.302 cw(c3.357,0.446) 3.435,0.286 cw(c3.334,0.492) 3.403,0.273 cw(c3.31,0.568) 3.365,0.264 cw(c3.289,0.682) 3.323,0.258 cw(c3.277,0.838) 3.276,0.256 cw(c3.272,0.641) 3.207,0.262 cw(c3.25,0.503) 3.178,0.269 cw(c3.232,0.444) 3.152,0.279 cw(c3.214,0.407) 3.131,0.292 cw(c3.2,0.388) 3.113,0.307 cw(c3.201,0.386) 3.084,0.371 cw(c3.256,0.397) 3.082,0.397 ; 4.226,0.406 ccw(c4.978,0.396) 4.241,0.248 ccw(c4.67,0.339) 4.26,0.183 ccw(c4.567,0.3) 4.287,0.128 ccw(c4.521,0.272) 4.322,0.082 ccw(c4.528,0.282) 4.421,0.016 ccw(c4.575,0.391) 4.484,-0.004 ccw(c4.612,0.552) 4.557,-0.016 ccw(c4.638,0.813) 4.641,-0.02 4.787,-0.02 ccw(c4.788,0.012) 4.797,-0.019 ccw(c4.789,0.007) 4.801,-0.018 ccw(c4.79,0.005) 4.815,0.002 ccw(c4.78,0.007) 4.815,0.007 4.815,0.281 ccw(c4.783,0.281) 4.814,0.29 ccw(c4.788,0.283) 4.812,0.294 ccw(c4.79,0.283) 4.792,0.309 ccw(c4.788,0.274) 4.787,0.309 4.729,0.309 cw(c4.727,0.493) 4.686,0.313 cw(c4.712,0.42) 4.669,0.319 cw(c4.703,0.398) 4.654,0.327 cw(c4.702,0.395) 4.623,0.368 cw(c4.75,0.415) 4.618,0.388 cw(c4.808,0.427) 4.614,0.41 cw(c4.899,0.435) 4.613,0.436 4.613,1.85 ccw(c4.581,1.85) 4.612,1.859 ccw(c4.586,1.851) 4.61,1.863 ccw(c4.588,1.852) 4.59,1.877 ccw(c4.586,1.843) 4.585,1.877 4.254,1.877 ccw(c4.253,1.845) 4.244,1.876 ccw(c4.252,1.85) 4.24,1.875 ccw(c4.251,1.852) 4.226,1.855 ccw(c4.261,1.85) 4.226,1.85 4.226,0.406 ; 4.929,-0.483 cw(c4.963,-0.48) 4.93,-0.474 5.24,1.294 cw(c5.283,1.287) 5.241,1.299 cw(c5.278,1.288) 5.242,1.303 cw(c5.269,1.293) 5.261,1.32 cw(c5.27,1.289) 5.27,1.321 5.439,1.321 cw(c5.439,1.288) 5.444,1.321 cw(c5.44,1.295) 5.448,1.32 cw(c5.443,1.302) 5.459,1.311 cw(c5.441,1.301) 5.461,1.307 cw(c5.437,1.3) 5.461,1.303 cw(c5.428,1.3) 5.461,1.294 5.439,1.166 5.442,1.166 cw(c5.805,0.895) 5.639,1.317 cw(c5.817,0.859) 5.731,1.343 cw(c5.835,0.753) 5.837,1.352 cw(c5.839,0.857) 5.909,1.347 cw(c5.851,0.944) 5.973,1.332 cw(c5.877,1.017) 6.124,1.234 cw(c5.863,1.007) 6.16,1.185 cw(c5.822,0.983) 6.188,1.128 cw(c5.754,0.956) 6.208,1.065 cw(c5.599,0.922) 6.225,0.917 cw(c5.112,0.919) 6.223,0.856 cw(c4.725,0.941) 6.218,0.791 cw(c4.145,1.005) 6.169,0.51 cw(c4.405,0.941) 6.151,0.443 cw(c4.74,0.845) 6.132,0.38 cw(c5.291,0.654) 6.089,0.273 cw(c5.429,0.597) 6.056,0.213 cw(c5.529,0.536) 6.019,0.159 cw(c5.594,0.486) 5.979,0.113 cw(c5.641,0.439) 5.888,0.039 cw(c5.644,0.438) 5.783,-0.008 cw(c5.624,0.497) 5.725,-0.023 cw(c5.603,0.623) 5.599,-0.034 cw(c5.599,0.514) 5.545,-0.032 cw(c5.59,0.43) 5.496,-0.024 cw(c5.577,0.367) 5.452,-0.012 cw(c5.563,0.323) 5.412,0.004 cw(c5.537,0.274) 5.262,0.159 5.259,0.159 5.148,-0.474 cw(c5.089,-0.464) 5.147,-0.479 cw(c5.101,-0.467) 5.146,-0.483 cw(c5.11,-0.47) 5.144,-0.487 cw(c5.116,-0.474) 5.142,-0.491 cw(c5.122,-0.477) 5.137,-0.497 cw(c5.123,-0.479) 5.13,-0.5 cw(c5.121,-0.472) 5.121,-0.502 4.952,-0.502 cw(c4.952,-0.469) 4.947,-0.501 cw(c4.951,-0.476) 4.943,-0.5 cw(c4.948,-0.483) 4.932,-0.491 cw(c4.95,-0.482) 4.93,-0.487 cw(c4.954,-0.481) 4.929,-0.483 ; 5.323,0.439 cw(c6.208,0.429) 5.329,0.533 cw(c6.968,0.35) 5.336,0.588 cw(c7.364,0.293) 5.345,0.645 cw(c7.502,0.27) 5.368,0.76 cw(c7.073,0.368) 5.381,0.813 cw(c6.581,0.499) 5.395,0.861 cw(c6.094,0.648) 5.409,0.902 cw(c5.724,0.787) 5.422,0.934 cw(c5.874,0.711) 5.472,1.014 cw(c5.794,0.769) 5.5,1.047 cw(c5.762,0.799) 5.53,1.076 cw(c5.742,0.822) 5.749,1.153 cw(c5.754,0.818) 5.845,1.14 cw(c5.782,0.927) 5.883,1.125 cw(c5.797,0.957) 5.915,1.104 cw(c5.796,0.958) 5.963,1.046 cw(c5.751,0.932) 5.978,1.01 cw(c5.685,0.91) 5.989,0.97 cw(c5.584,0.889) 5.996,0.925 cw(c5.442,0.877) 5.998,0.876 cw(c5.03,0.883) 5.993,0.784 cw(c4.517,0.929) 5.987,0.731 cw(c4.351,0.949) 5.942,0.512 cw(c4.897,0.804) 5.927,0.462 cw(c5.196,0.704) 5.91,0.417 cw(c5.456,0.599) 5.893,0.378 cw(c5.476,0.58) 5.848,0.304 cw(c5.54,0.534) 5.822,0.273 cw(c5.576,0.5) 5.763,0.222 cw(c5.585,0.49) 5.617,0.17 cw(c5.575,0.558) 5.574,0.168 cw(c5.571,0.49) 5.482,0.18 cw(c5.548,0.402) 5.444,0.195 cw(c5.536,0.377) 5.345,0.307 cw(c5.613,0.412) 5.332,0.347 cw(c5.685,0.428) 5.325,0.391 cw(c5.781,0.438) 5.323,0.439 ; 6.431,0.301 cw(c7.024,0.302) 6.437,0.388 cw(c6.831,0.341) 6.581,0.649 cw(c6.853,0.308) 6.646,0.692 cw(c6.896,0.228) 6.721,0.725 cw(c6.942,0.098) 6.806,0.749 cw(c6.998,-0.202) 7.006,0.768 7.296,0.768 ccw(c7.297,0.797) 7.3,0.768 ccw(c7.297,0.79) 7.302,0.769 ccw(c7.299,0.784) 7.309,0.772 ccw(c7.299,0.784) 7.311,0.774 ccw(c7.297,0.786) 7.313,0.776 ccw(c7.293,0.788) 7.314,0.779 ccw(c7.281,0.793) 7.316,0.785 7.335,0.893 ccw(c6.706,1.006) 7.343,0.946 ccw(c6.968,0.982) 7.344,0.992 ccw(c7.116,0.986) 7.339,1.033 ccw(c7.207,1.007) 7.309,1.096 ccw(c7.211,1.008) 7.281,1.119 ccw(c7.184,0.965) 7.246,1.136 ccw(c7.147,0.862) 7.201,1.149 ccw(c7.09,0.521) 7.081,1.158 ccw(c7.08,0.459) 7.037,1.157 ccw(c7.073,0.555) 6.957,1.146 ccw(c7.046,0.676) 6.754,1.056 cw(c6.716,1.112) 6.749,1.053 cw(c6.724,1.098) 6.745,1.051 cw(c6.729,1.086) 6.74,1.049 cw(c6.732,1.077) 6.736,1.048 cw(c6.733,1.071) 6.732,1.048 cw(c6.733,1.066) 6.724,1.05 cw(c6.733,1.066) 6.721,1.052 cw(c6.737,1.071) 6.716,1.059 6.666,1.183 cw(c6.704,1.198) 6.664,1.187 cw(c6.699,1.197) 6.663,1.195 cw(c6.69,1.197) 6.674,1.219 cw(c6.979,0.809) 6.708,1.242 cw(c7.016,0.749) 6.745,1.264 cw(c7.063,0.658) 6.829,1.3 cw(c7.104,0.545) 6.922,1.328 cw(c7.129,0.434) 7.131,1.352 cw(c7.134,0.187) 7.229,1.348 cw(c7.169,0.608) 7.314,1.336 cw(c7.222,0.869) 7.387,1.316 cw(c7.276,1.015) 7.446,1.286 cw(c7.324,1.09) 7.527,1.2 cw(c7.295,1.076) 7.55,1.142 cw(c7.195,1.051) 7.561,1.073 cw(c6.863,1.04) 7.548,0.904 7.393,0.024 cw(c7.35,0.031) 7.392,0.019 cw(c7.355,0.03) 7.391,0.015 cw(c7.364,0.025) 7.372,-0.002 cw(c7.363,0.029) 7.363,-0.004 7.211,-0.004 cw(c7.211,0.029) 7.206,-0.003 cw(c7.21,0.022) 7.202,-0.002 cw(c7.207,0.015) 7.19,0.007 cw(c7.209,0.016) 7.189,0.011 cw(c7.213,0.017) 7.188,0.015 cw(c7.222,0.018) 7.189,0.024 7.208,0.143 7.205,0.143 cw(c6.901,0.365) 7.153,0.085 cw(c6.88,0.389) 7.086,0.036 cw(c6.851,0.439) 7.004,-0.001 cw(c6.828,0.501) 6.958,-0.015 cw(c6.814,0.558) 6.908,-0.026 cw(c6.798,0.669) 6.796,-0.034 cw(c6.795,0.466) 6.733,-0.03 cw(c6.787,0.402) 6.675,-0.019 cw(c6.773,0.351) 6.622,-0.001 cw(c6.738,0.282) 6.448,0.187 cw(c6.794,0.298) 6.431,0.301 ; 6.649,0.331 cw(c6.952,0.335) 6.662,0.422 cw(c6.87,0.357) 6.678,0.461 cw(c6.864,0.357) 6.772,0.549 cw(c6.917,0.261) 6.819,0.568 cw(c6.955,0.145) 6.874,0.582 cw(c6.988,-0.034) 6.938,0.591 cw(c7.01,-0.291) 7.012,0.594 7.266,0.594 cw(c7.266,0.569) 7.272,0.593 cw(c7.268,0.578) 7.274,0.592 cw(c7.27,0.582) 7.277,0.591 cw(c7.271,0.583) 7.278,0.59 cw(c7.271,0.583) 7.28,0.586 cw(c7.268,0.583) 7.281,0.583 cw(c7.263,0.582) 7.28,0.58 cw(c7.256,0.583) 7.28,0.577 7.252,0.422 cw(c6.949,0.469) 7.044,0.178 cw(c6.902,0.572) 6.994,0.163 cw(c6.889,0.628) 6.94,0.154 cw(c6.882,0.695) 6.882,0.151 cw(c6.878,0.559) 6.797,0.159 cw(c6.852,0.423) 6.762,0.169 cw(c6.832,0.367) 6.732,0.183 cw(c6.814,0.333) 6.706,0.2 cw(c6.802,0.317) 6.651,0.299 cw(c6.868,0.33) 6.649,0.331 ; 9.058,0.015 ccw(c9.083,0.017) 9.059,0.011 ccw(c9.079,0.016) 9.06,0.007 ccw(c9.077,0.015) 9.072,-0.002 ccw(c9.08,0.022) 9.076,-0.003 ccw(c9.081,0.029) 9.081,-0.004 9.247,-0.004 ccw(c9.247,0.029) 9.256,-0.002 ccw(c9.248,0.025) 9.275,0.015 ccw(c9.239,0.03) 9.276,0.019 ccw(c9.234,0.031) 9.277,0.024 9.338,0.375 9.617,0.668 9.877,0.024 ccw(c9.966,0.061) 9.883,0.014 ccw(c9.928,0.04) 9.885,0.009 ccw(c9.916,0.031) 9.888,0.006 ccw(c9.91,0.026) 9.891,0.003 ccw(c9.909,0.024) 9.903,-0.003 ccw(c9.912,0.037) 9.908,-0.004 ccw(c9.913,0.053) 9.913,-0.004 10.088,-0.004 ccw(c10.088,0.023) 10.101,0 ccw(c10.09,0.019) 10.107,0.005 ccw(c10.092,0.017) 10.111,0.012 ccw(c10.092,0.017) 10.11,0.024 9.781,0.821 10.256,1.294 ccw(c10.235,1.312) 10.261,1.302 ccw(c10.243,1.308) 10.262,1.306 ccw(c10.247,1.308) 10.262,1.309 ccw(c10.249,1.308) 10.261,1.313 ccw(c10.25,1.308) 10.257,1.318 ccw(c10.248,1.306) 10.254,1.32 ccw(c10.247,1.302) 10.25,1.321 ccw(c10.246,1.296) 10.245,1.321 10.043,1.321 ccw(c10.043,1.233) 10.031,1.321 ccw(c10.039,1.264) 10.026,1.32 ccw(c10.037,1.272) 10.011,1.314 ccw(c10.046,1.256) 10.007,1.31 ccw(c10.062,1.236) 10.002,1.307 ccw(c10.091,1.201) 9.996,1.302 ccw(c10.148,1.14) 9.991,1.296 9.396,0.696 9.601,1.85 ccw(c9.567,1.856) 9.601,1.859 ccw(c9.577,1.856) 9.6,1.863 ccw(c9.58,1.857) 9.599,1.867 ccw(c9.582,1.858) 9.588,1.876 ccw(c9.58,1.851) 9.583,1.877 ccw(c9.579,1.844) 9.579,1.877 9.413,1.877 ccw(c9.413,1.845) 9.403,1.876 ccw(c9.412,1.849) 9.385,1.859 ccw(c9.421,1.844) 9.383,1.855 ccw(c9.426,1.843) 9.382,1.85 9.059,0.024 ccw(c9.092,0.018) 9.058,0.015